# Altium footprint library ST封装.PcbLib: 1336 footprints (part 76 of 109)
Each footprint in its own frame and in the unit in brackets; x right, y up, seen from the top. Pads: shape width x height; smd on the part's side, far side on the other; paste and mask are expansions set on the pad; w line width, h text height; cw(c..) or ccw(c..) is an arc to the next point about the centre after c.
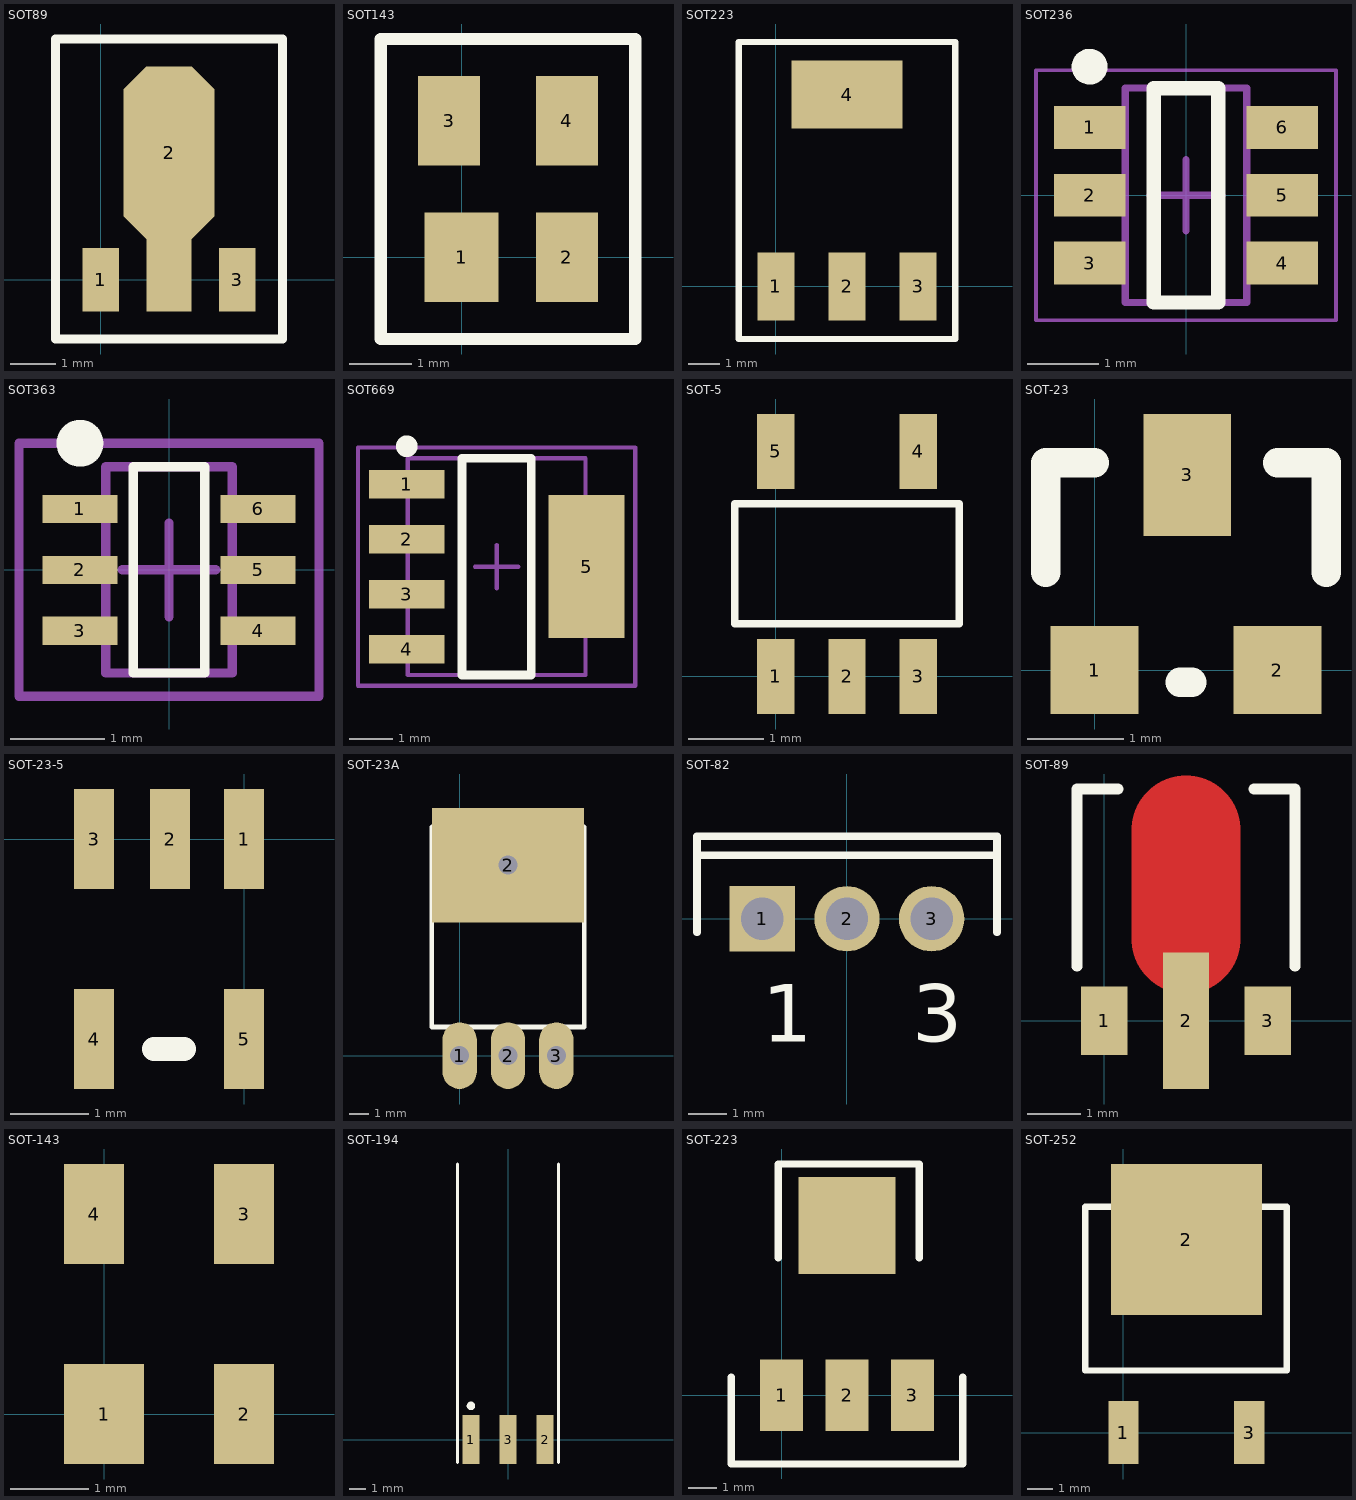
[diagram p75: the footprints below, top view; thin cyan lines are the x and y axes]

## SOT89 [mm]
pads (4):
  rect 0.8x1.4 smd: 1(0,0) 3(3,0)
  oct 2x3.8 smd: 2(1.5,2.8)
  rect 1x1.854 smd: ""(1.5,0.227)
Top Overlay:
  lines w0.2: -1,-1.3 -1,5.3 4,5.3 4,-1.3 -1,-1.3

## SOT143 [mm]
pads (4):
  rect 1.2x1.44 smd: 1(0,0)
  rect 1x1.44 smd: 2(1.7,0) 3(-0.2,2.2) 4(1.7,2.2)
Top Overlay:
  lines w0.2: -1.3,-1.32 -1.3,3.52 2.8,3.52 2.8,-1.32 -1.3,-1.32

## SOT223 [mm]
pads (4):
  rect 1.2x2.2 smd: 1(0,0) 2(2.3,0) 3(4.6,0)
  rect 3.6x2.2 smd: 4(2.3,6.2)
Top Overlay:
  lines w0.2: -1.2,-1.7 5.8,-1.7 5.8,7.9 -1.2,7.9 -1.2,-1.7

## SOT236 [mm] "John"
pads (6):
  rect 1x0.6 smd: 1(-1.35,0.95) 2(-1.35,0) 3(-1.35,-0.95) 4(1.35,-0.95) 5(1.35,0) 6(1.35,0.95)
Top Overlay:
  circle w0.25: c-1.35,1.8 r0.125
  lines w0.2: -0.45,-1.5 0.45,-1.5 0.45,1.5 -0.45,1.5 -0.45,-1.5
Mechanical 13:
  lines w0.1: -0.85,-1.5 -0.85,1.5 0.85,1.5 0.85,-1.5 -0.85,-1.5
Mechanical 15:
  lines w0.05: -2.1,-1.75 -2.1,1.75 2.1,1.75 2.1,-1.75 -2.1,-1.75
  lines w0.1: -0.5,0 0.5,0 ; 0,-0.5 0,0.5

## SOT363 [mm] "John"
pads (6):
  rect 0.8x0.3 smd: 1(-0.95,0.65) 2(-0.95,0) 3(-0.95,-0.65) 4(0.95,-0.65) 5(0.95,0) 6(0.95,0.65)
Top Overlay:
  circle w0.25: c-0.95,1.35 r0.125
  lines w0.1: -0.381,-1.1 -0.381,1.1 0.381,1.1 0.381,-1.1 -0.381,-1.1
Mechanical 13:
  lines w0.1: -0.675,-1.1 0.675,-1.1 0.675,1.1 -0.675,1.1 -0.675,-1.1
Mechanical 15:
  lines w0.1: -0.5,0 0.5,0 ; 0,-0.5 0,0.5 ; -1.6,-1.35 1.6,-1.35 1.6,1.35 -1.6,1.35 -1.6,-1.35
3D body: height 1, standoff 0.1, extent -0.675,-1.1 0.675,1.1

## SOT669 [mm]
pads (5):
  rect 1.75x0.65 smd: 1(-1257.457,-1258.38) 2(-1257.457,-1259.649) 3(-1257.457,-1260.919) 4(-1257.457,-1262.189)
  rect 1.75x3.3 smd: 5(-1253.307,-1260.284)
Top Overlay:
  circle w0.25: c-1257.457,-1257.505 r0.125
  lines w0.2: -1256.182,-1262.785 -1256.182,-1257.784 -1254.582,-1257.784 -1254.582,-1262.785 -1256.182,-1262.785
Mechanical 13:
  lines w0.1: -1257.432,-1262.785 -1257.432,-1257.784 -1253.332,-1257.784 -1253.332,-1262.785 -1257.432,-1262.785
Mechanical 15:
  lines w0.1: -1255.882,-1260.284 -1254.882,-1260.284 ; -1255.382,-1260.784 -1255.382,-1259.785 ; -1258.582,-1263.034 -1258.582,-1257.535 -1252.182,-1257.535 -1252.182,-1263.034 -1258.582,-1263.034
3D body "User Library-SOT669-CW.step": height 1.15, standoff -0.05, extent -1258.599,-1262.748 -1252.171,-1257.848

## SOT-5 [mm]
pads (5):
  rect 0.5x1 smd: 1(0,0) 2(0.95,0) 3(1.9,0) 4(1.9,3) 5(0,3)
Top Overlay:
  lines w0.1: -0.55,0.7 -0.55,2.3 2.45,2.3 2.45,0.7 -0.55,0.7

## SOT-23 [mil]
pads (3):
  rect 36x36 smd: 1(0,0) 2(75,0)
  rect 36x50 smd: 3(38,80)
Top Overlay:
  lines w12: -20,40 -20,85 0,85 ; 35,-5 40,-5 ; 75,85 95,85 95,40

## SOT-23-5 [mil]
pads (5):
  rect 20x50 smd: 1(0,0) 2(-37,0) 3(-75,0) 4(-75,-100) 5(0,-100)
Top Overlay:
  lines w12: -45,-105 -30,-105
3D body "SOT-23-5.STEP": height 47.24, standoff 0, extent -92.09,-100.12 22.09,10.11

## SOT-23A [mm]
pads (4):
  oval 1.8x3.5 on Top hole 1: 1(0,0) 2(2.54,0) 3(5.08,0)
  rect 8x6 on Top hole 1: 2(2.54,10)
Top Overlay:
  lines w0.254: -1.46,1.5 -1.46,12 6.54,12 6.54,1.5 -1.46,1.5

## SOT-82 [mm] "SIP; 3 Leads; Body 10.9 x 7.6 x 2.4 mm (typ); Pitch 2.2 mm"
height 13.9
pads (3):
  rect 1.7x1.7 hole 1.1: 1(-2.2,0)
  round 1.7 hole 1.1: 2(0,0) 3(2.2,0)
Top Overlay:
  lines w0.2: -3.9,-0.35 -3.9,2.15 3.9,2.15 3.9,-0.35 ; -3.9,1.65 3.9,1.65
  text "1" at -2.2,-3.2 h1.5
  text "3" at 1.7,-3.2 h1.5

## SOT-89 [mil]
pads (3):
  rect 34x50 smd: 1(0,0) 3(120,0)
  rect 34x100 smd: 2(60,0)
Top Layer:
  lines w80: 60,60 60,140
Top Overlay:
  lines w8: -20,40 -20,170 10,170 ; 110,170 140,170 140,40

## SOT-143 [mil]
pads (4):
  rect 40x50 smd: 1(0,0)
  rect 30x50 smd: 2(70,0) 3(70,100) 4(-5,100)

## SOT-194 [mm] "Single-Ended SM Package; 3 Leads; Body 17.1 (inc. leads) x 7.8 mm (LxW max)"
height 2.7
pads (3):
  rect 1x2.9 smd: 1(-2.2,0) 2(2.2,0) 3(0,0)
Top Overlay:
  circle w0.25: c-2.2,2 r0.125
  lines w0.2: -3,-1.35 -3,16.35 ; 3,-1.35 3,16.35

## SOT-223 [mm]
pads (4):
  rect 1.524x2.5 smd: 1(0,0) 2(2.3,0) 3(4.6,0)
  rect 3.4x3.4 smd: ""(2.3,5.969)
Top Overlay:
  lines w0.254: -1.764,0.635 -1.764,-2.413 6.364,-2.413 6.364,0.635 ; -0.113,4.826 -0.113,8.128 4.84,8.128 4.84,4.826

## SOT-252 [mm]
pads (3):
  rect 1.2x2.5 smd: 1(0,0) 3(5,0)
  rect 6x6 smd: 2(2.5,7.661)
Top Overlay:
  lines w0.254: -1.513,2.464 6.487,2.464 6.487,8.964 -1.513,8.964 -1.513,2.464